# Altium footprint library 电容封装库.PcbLib: 100 footprints (part 6 of 7)
Each footprint in its own frame and in the unit in brackets; x right, y up, seen from the top. Pads: shape width x height; smd on the part's side, far side on the other; paste and mask are expansions set on the pad; w line width, h text height; cw(c..) or ccw(c..) is an arc to the next point about the centre after c.
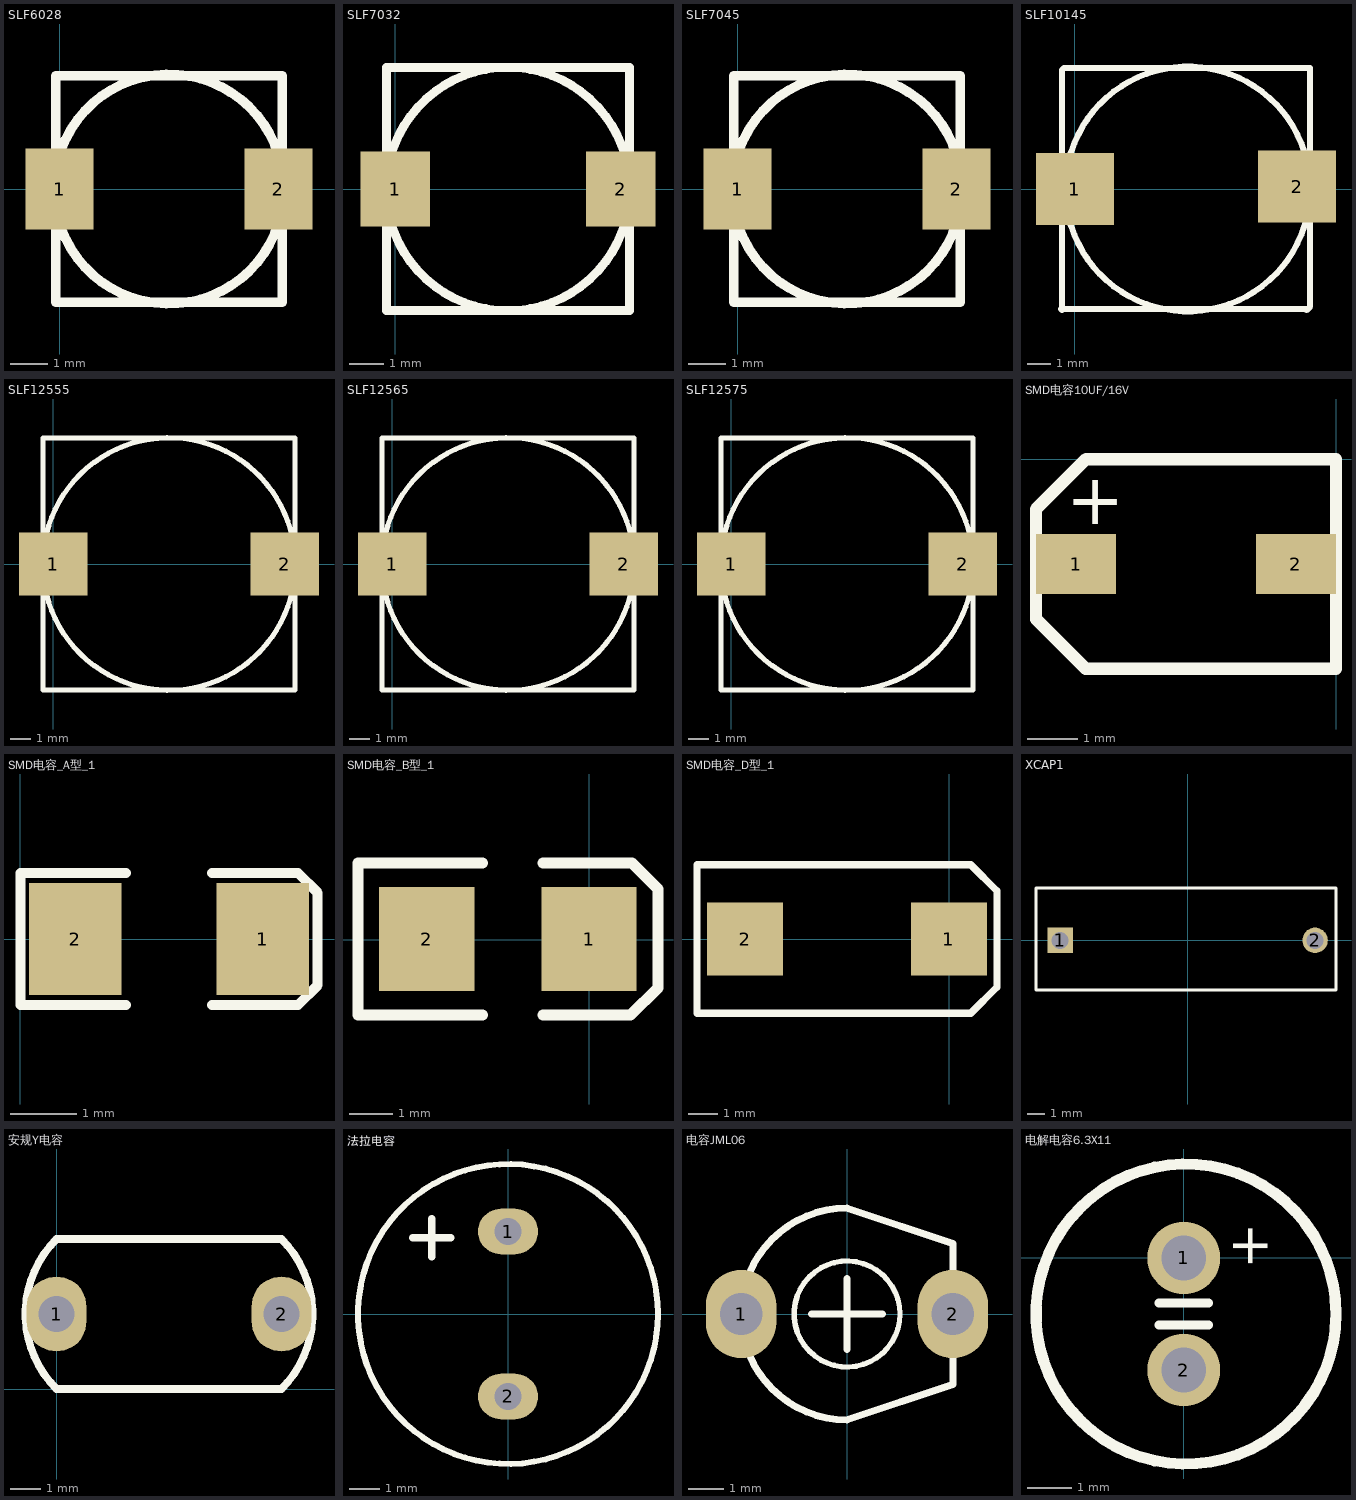
[diagram p5: the footprints below, top view; thin cyan lines are the x and y axes]

## SLF6028 [mm]
pads (2):
  rect 1.8x2.15 smd: 1(0,0) 2(5.8,0)
Top Overlay:
  circle w0.254: c2.9,0 r3.041
  lines w0.254: -0.1,-3 5.9,-3 5.9,3 -0.1,3 -0.1,-3

## SLF7032 [mm]
pads (2):
  rect 2x2.15 smd: 1(0,0) 2(6.5,0)
Top Overlay:
  circle w0.254: c3.25,0 r3.509
  lines w0.254: -0.25,-3.5 -0.25,3.5 6.75,3.5 6.75,-3.5 -0.25,-3.5

## SLF7045 [mm]
pads (2):
  rect 1.8x2.15 smd: 1(0,0) 2(5.8,0)
Top Overlay:
  circle w0.254: c2.9,0 r3.041
  lines w0.254: -0.1,-3 -0.1,3 5.9,3 5.9,-3 -0.1,-3

## SLF10145 [mil]
pads (2):
  rect 130x120 smd: 1(0,0) 2(370.08,3.94)
Top Overlay:
  circle w10: c188.04,0 r204.01
  lines w10: -22.96,-200 385.04,-200 ; -21.96,-202 -21.96,0 ; -21.96,-12 -21.96,198 -17.96,202 392.04,202 392.04,-196 ; 392.04,-196 386.04,-202 392.04,-196

## SLF12555 [mm]
pads (2):
  rect 3.4x3.15 smd: 1(0,0) 2(11.5,0)
Top Overlay:
  circle w0.254: c5.75,0 r6.27
  lines w0.254: -0.5,-6.25 -0.5,6.25 12,6.25 12,-6.25 -0.5,-6.25

## SLF12565 [mm]
pads (2):
  rect 3.4x3.15 smd: 1(0,0) 2(11.5,0)
Top Overlay:
  circle w0.254: c5.75,0 r6.27
  lines w0.254: -0.5,-6.25 12,-6.25 12,6.25 -0.5,6.25 -0.5,-6.25

## SLF12575 [mm]
pads (2):
  rect 3.4x3.15 smd: 1(0,0) 2(11.5,0)
Top Overlay:
  circle w0.254: c5.75,0 r6.27
  lines w0.254: -0.5,-6.25 -0.5,6.25 12,6.25 12,-6.25 -0.5,-6.25

## SMD电容10UF/16V [mm]
pads (2):
  rect 1.6x1.2 smd: 1(-5.2,-2.1) 2(-0.8,-2.1)
Top Overlay:
  lines w0.25: -6,-3.2 -5,-4.2 0,-4.2 0,0 -5,0 -6,-1 -6,-3.2
  text "+" at -5.4,-1.3 h1.02

## SMD电容_A型_1 [mm]
pads (2):
  rect 1.4x1.7 smd: 1(3.67,0) 2(0.83,0)
Top Overlay:
  lines w0.15: 1.6,-1 0,-1 0,1 1.6,1 ; 2.9,-1 4,-1 4.2,-1 4.5,-0.7 4.5,0.7 4.2,1 3.9,1 ; 2.9,1 4,1 4.1,1 ; 3.9,-1 4.1,-1

## SMD电容_B型_1 [mm]
pads (2):
  rect 2.2x2.4 smd: 1(-0.011,0.009) 2(-3.751,0.009)
Top Overlay:
  lines w0.254: -2.467,-1.742 -5.341,-1.742 -5.341,1.77 -2.467,1.77 ; -1.07,-1.742 0.949,-1.742 1.58,-1.114 1.58,1.172 0.979,1.77 -1.07,1.77

## SMD电容_D型_1 [mm]
pads (2):
  rect 2.6x2.5 smd: 1(-0.005,0.001) 2(-7.005,0.001)
Top Overlay:
  lines w0.254: -8.655,-2.549 0.745,-2.549 1.645,-1.649 1.645,1.651 0.745,2.551 -8.655,2.551 -8.655,-2.549

## XCAP1 [mm] "pin 15mm,body 16mm X 6mm"
height 12
pads (2):
  rect 1.5x1.5 hole 1: 1(-7.495,0)
  round 1.5 hole 1: 2(7.495,0)
Top Overlay:
  lines w0.2: -8.915,-2.92 8.725,-2.92 8.725,3.08 -8.915,3.08 -8.915,-2.92
3D body: height 12, standoff 0, extent -8.78,-2.8 8.68,2.94

## 安规Y电容 [mm]
height 7.5
pads (2):
  oval 2x2.5 hole 1.2: 1(0,2.5) 2(7.5,2.5)
Top Overlay:
  lines w0.254: 0,0 cw(c2.5,2.5) 0,5 7.5,5 cw(c5,2.5) 7.5,0 0,0

## 法拉电容 [mm] "5F/2.7V"
height 10
pads (2):
  oval 2x1.524 hole 0.9: 1(0,2.75) 2(0,-2.75)
Top Overlay:
  circle w0.2: c0,0 r5
  lines w0.254: -3.175,2.54 -1.905,2.54 ; -2.54,1.905 -2.54,3.175

## 电容JML06 [mm]
pads (2):
  oval 2x2.5 hole 1.2: 1(-3,0) 2(3,0)
Top Overlay:
  circle w0.15: c0,0 r1.5
  lines w0.2: -1,0 1,0 ; 0,-1 0,1 ; 0,-3 cw(c0,0) 0,3 3,2 3,-2 0,-3

## 电解电容6.3X11 [mil]
height 433.07
pads (2):
  round 65 hole 40: 1(0,0) 2(0,-100)
Top Overlay:
  circle w10: c2,-50 r133.86
  lines w8: -22,-60 22,-60 ; -22,-40 22,-40
  text "+" at 75,-10 h36